# Altium integrated library Op Amp - Comp.IntLib: 109 symbols
Pins are listed as number, name and electrical type; pins without a type are passive.

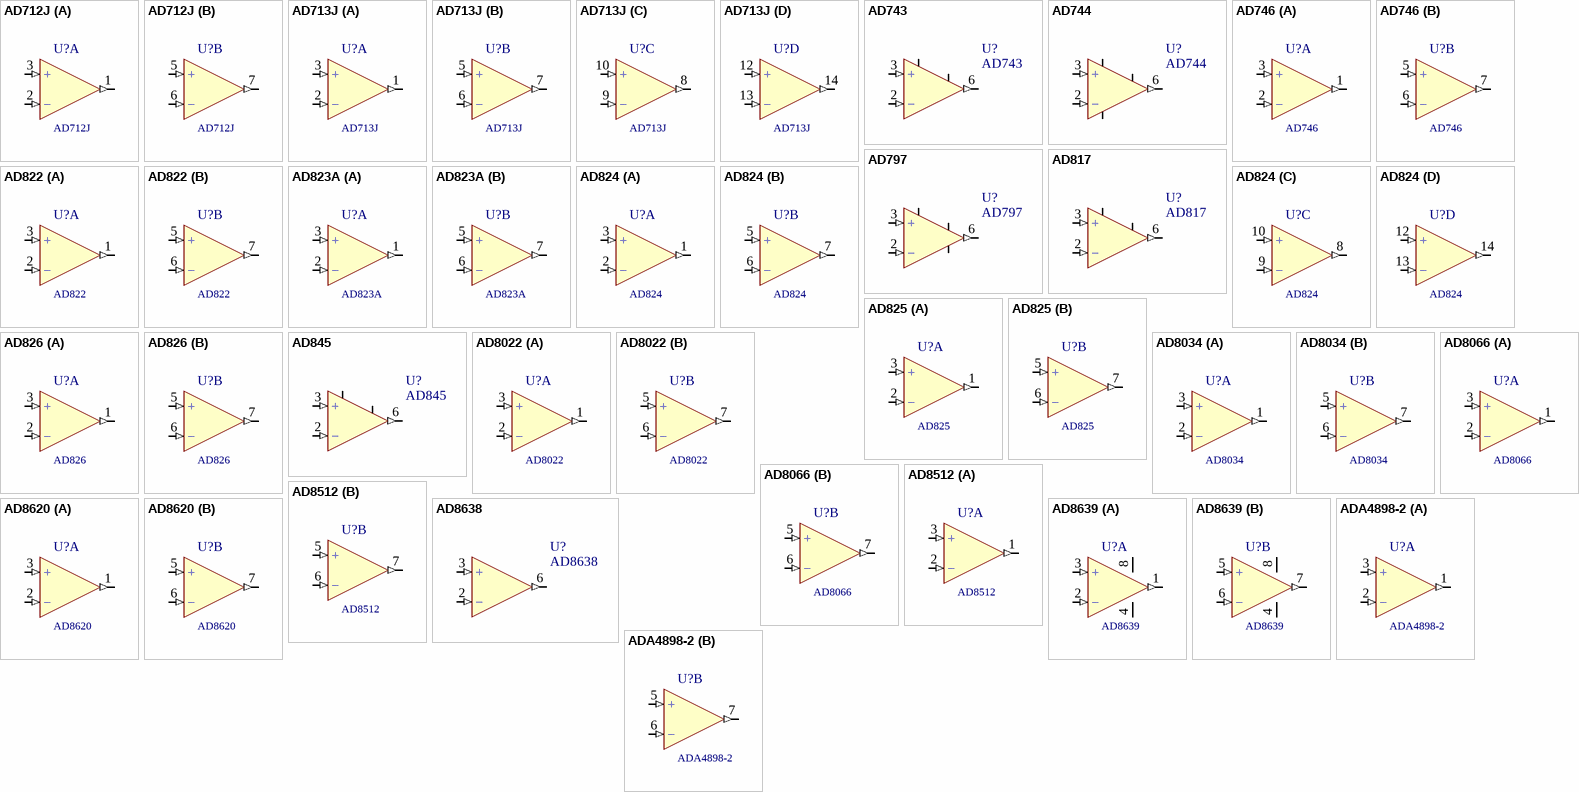
[diagram p0: symbols AD712J to ADA4898-2]

## AD712J
designator U?
FET 3mV 20uV/C 4MHz 20/Vus 2.5mA 9-36V; Price: 6
footprint SO8-150
simulation model AD712J (Model Description)
pins on every part: 4 V- (power) hidden to V-, 8 V+ (power) hidden to V+
part A pins: 1 OUT (out), 2 -IN (in), 3 +IN (in)
part B pins: 5 +IN (in), 6 -IN (in), 7 OUT (out)

## AD713J
designator U?
FET 1.5mV 20uV/C 4MHz 20/Vus 2.5mA 9-36V; Price: 26
footprint SO14-150
simulation model AD713J (Model Description)
pins on every part: 4 V+ (power) hidden to V+, 11 V- (power) hidden to V-
part A pins: 1 OUT (out), 2 IN- (in), 3 IN+ (in)
part B pins: 5 IN+ (in), 6 IN- (in), 7 OUT (out)
part C pins: 8 OUT (out), 9 IN- (in), 10 IN+ (in)
part D pins: 12 IN+ (in), 13 IN- (in), 14 OUT (out)

## AD743
designator U?
FET 1mV  4.5MHz 2.8V/uS  8.1mA 36V; Price: 0.8
footprint DIL8-300a
simulation model AD743 (SUBCKT)
pins: 1 N1/Comp, 2 -IN (in), 3 +IN (in), 4 V- (power) hidden to V-, 5 N2/Comp, 6 OUT (out), 7 V+ (power) hidden to V+

## AD744
designator U?
FET 1mV 13MHz 75V/uS 3.5mA 9-36V; Price: 13.8
footprint DIL8-300a
simulation model AD744 (SubCKT)
pins: 1 Nul, 2 -IN (in), 3 +IN (in), 4 V- (power) hidden to V-, 5 Com2, 6 OUT (out), 7 V+ (power) hidden to V+, 8 Nul/Com1

## AD746
designator U?
FET 1.5mV 13MHz  75V/uS 7mA 9-36V; Price: 28
footprint DIL8-300a
simulation model AD746 (Model Description)
pins on every part: 4 V- (power) hidden to V-, 8 V+ (power) hidden to V+
part A pins: 1 OUT (out), 2 -IN (in), 3 +IN (in)
part B pins: 5 +IN (in), 6 -IN (in), 7 OUT (out)

## AD797
designator U?
0.9nV/Hz 80uV 110MHz 20V/uS 36V; Price: 27
footprint DIL8-300a
simulation model AD797 (SubCKT)
pins: 1 Nul, 2 -IN (in), 3 +IN (in), 4 V- (power) hidden to V-, 5 Nul, 6 OUT (out), 7 V+ (power) hidden to V+, 8 Comp

## AD817
designator U?
2mV  50MHz 350V/uS  7mA 5-36V Rout 8om; Price: 0.8
footprint DIL8-300a
simulation model AD817 (SUBCKT)
pins: 1 N1, 2 -IN (in), 3 +IN (in), 4 V- (power) hidden to V-, 5 hidden, 6 OUT (out), 7 V+ (power) hidden to V+, 8 N2

## AD822
designator U?
FET 0.8mV 1.8MHz  3V/uS R/R Out 1.6mA 5-30V; Price: 18.7
footprint DIL8-300a
simulation model AD822 (Model Description)
pins on every part: 4 V- (power) hidden to V-, 8 V+ (power) hidden to V+
part A pins: 1 OUT (out), 2 -IN (in), 3 +IN (in)
part B pins: 5 +IN (in), 6 -IN (in), 7 OUT (out)

## AD823A
designator U?
FET 3.5mV 19MHz  35V/uS 6.3mA R/R Out 3-36V; Price: 16.4
footprint DIL8-300a
simulation model AD823AN (Model Description)
pins on every part: 4 V- (power) hidden to V-, 8 V+ (power) hidden to V+
part A pins: 1 OUT (out), 2 -IN (in), 3 +IN (in)
part B pins: 5 +IN (in), 6 -IN (in), 7 OUT (out)

## AD824
designator U?
FET 1.5mV 2MHz 22V/uS R/R Out 0.5mA 3-30V; Price: 25.4
footprint DIL14-300
simulation model AD824 (Model Description)
pins on every part: 4 V+ (power) hidden to V+, 11 V- (power) hidden to V-
part A pins: 1 OUT (out), 2 IN- (in), 3 IN+ (in)
part B pins: 5 IN+ (in), 6 IN- (in), 7 OUT (out)
part C pins: 8 OUT (out), 9 IN- (in), 10 IN+ (in)
part D pins: 12 IN+ (in), 13 IN- (in), 14 OUT (out)

## AD825
designator U?
FET 26MHz  125V/uS 36V; Price: 10.75
footprint DIL8-300a
simulation model AD825 (Model Description)
pins on every part: 4 V- (power) hidden to V-, 8 V+ (power) hidden to V+
part A pins: 1 OUT (out), 2 -IN (in), 3 +IN (in)
part B pins: 5 +IN (in), 6 -IN (in), 7 OUT (out)

## AD826
designator U?
50MHz  350V/uS 6.6mA 36V; Price: 14.43
footprint DIL8-300a
simulation model AD826 (Model Description)
pins on every part: 4 V- (power) hidden to V-, 8 V+ (power) hidden to V+
part A pins: 1 OUT (out), 2 -IN (in), 3 +IN (in)
part B pins: 5 +IN (in), 6 -IN (in), 7 OUT (out)

## AD845
designator U?
FET 0.25mV  12.8MHz 100V/uS  10mA 36V; Price: 0.8
footprint DIL8-300a
simulation model AD845 (SUBCKT)
pins: 1 N1, 2 -IN (in), 3 +IN (in), 4 V- (power) hidden to V-, 5 N2, 6 OUT (out), 7 V+ (power) hidden to V+

## AD8022
designator U?
130MHz  50V/uS 4mA 26V; Price: 9.17
footprint DIL8-300a
simulation model AD8022 (Model Description)
pins on every part: 4 V- (power) hidden to V-, 8 V+ (power) hidden to V+
part A pins: 1 OUT (out), 2 -IN (in), 3 +IN (in)
part B pins: 5 +IN (in), 6 -IN (in), 7 OUT (out)

## AD8034
designator U?
FET 40MHz  80V/uS 26V; Price: 9.17
footprint DIL8-300a
simulation model AD8034 (Model Description)
pins on every part: 4 V- (power) hidden to V-, 8 V+ (power) hidden to V+
part A pins: 1 OUT (out), 2 -IN (in), 3 +IN (in)
part B pins: 5 +IN (in), 6 -IN (in), 7 OUT (out)

## AD8066
designator U?
FET 60MHz 180V/uS 26.3V; Price: 11.3
footprint DIL8-300a
simulation model AD8066 (SubCKT)
pins on every part: 4 V- (power) hidden to V-, 8 V+ (power) hidden to V+
part A pins: 1 OUT (out), 2 -IN (in), 3 +IN (in)
part B pins: 5 +IN (in), 6 -IN (in), 7 OUT (out)

## AD8512
designator U?
FET 0.4mV 8MHz  20V/uS 2.2mA 36V; Price: 8.5
footprint DIL8-300a
simulation model AD8512 (Model Description)
pins on every part: 4 V- (power) hidden to V-, 8 V+ (power) hidden to V+
part A pins: 1 OUT (out), 2 -IN (in), 3 +IN (in)
part B pins: 5 +IN (in), 6 -IN (in), 7 OUT (out)

## AD8620
designator U?
FET 25MHz 50V/uS 27.3V; Price: 41.5
footprint DIL8-300a
simulation model AD8610-X (Model Description)
pins on every part: 4 V- (power) hidden to V-, 8 V+ (power) hidden to V+
part A pins: 1 OUT (out), 2 -IN (in), 3 +IN (in)
part B pins: 5 +IN (in), 6 -IN (in), 7 OUT (out)

## AD8638
designator U?
9uV 60nV/C 1.35MHz 2.5V/uS  1.3mA 5-16V; Price: 9
footprint DIL8-300a
simulation model AD8638 (SUBCKT)
pins: 2 -IN (in), 3 +IN (in), 4 V- (power) hidden to V-, 5 hidden, 6 OUT (out), 7 V+ (power) hidden to V+

## AD8639
designator U?
9uV 60nV/C 1.35MHz 2.5V/uS  1.3mA 5-16V; Price: 11.52
footprint SO8-150
pins on every part: 4 V- (power) hidden to V-, 8 V+ (power) hidden to V+
part A pins: 1 OUT (out), 2 -IN (in), 3 +IN (in)
part B pins: 5 +IN (in), 6 -IN (in), 7 OUT (out)

## ADA4898-2
designator U?
0.9nV/Hz 65MHz  55V/uS 7.5mA 33V; Price: 21.4
footprint DIL8-300a
simulation model ADA4898 (Model Description)
pins on every part: 4 V- (power) hidden to V-, 8 V+ (power) hidden to V+
part A pins: 1 OUT (out), 2 -IN (in), 3 +IN (in)
part B pins: 5 +IN (in), 6 -IN (in), 7 OUT (out)

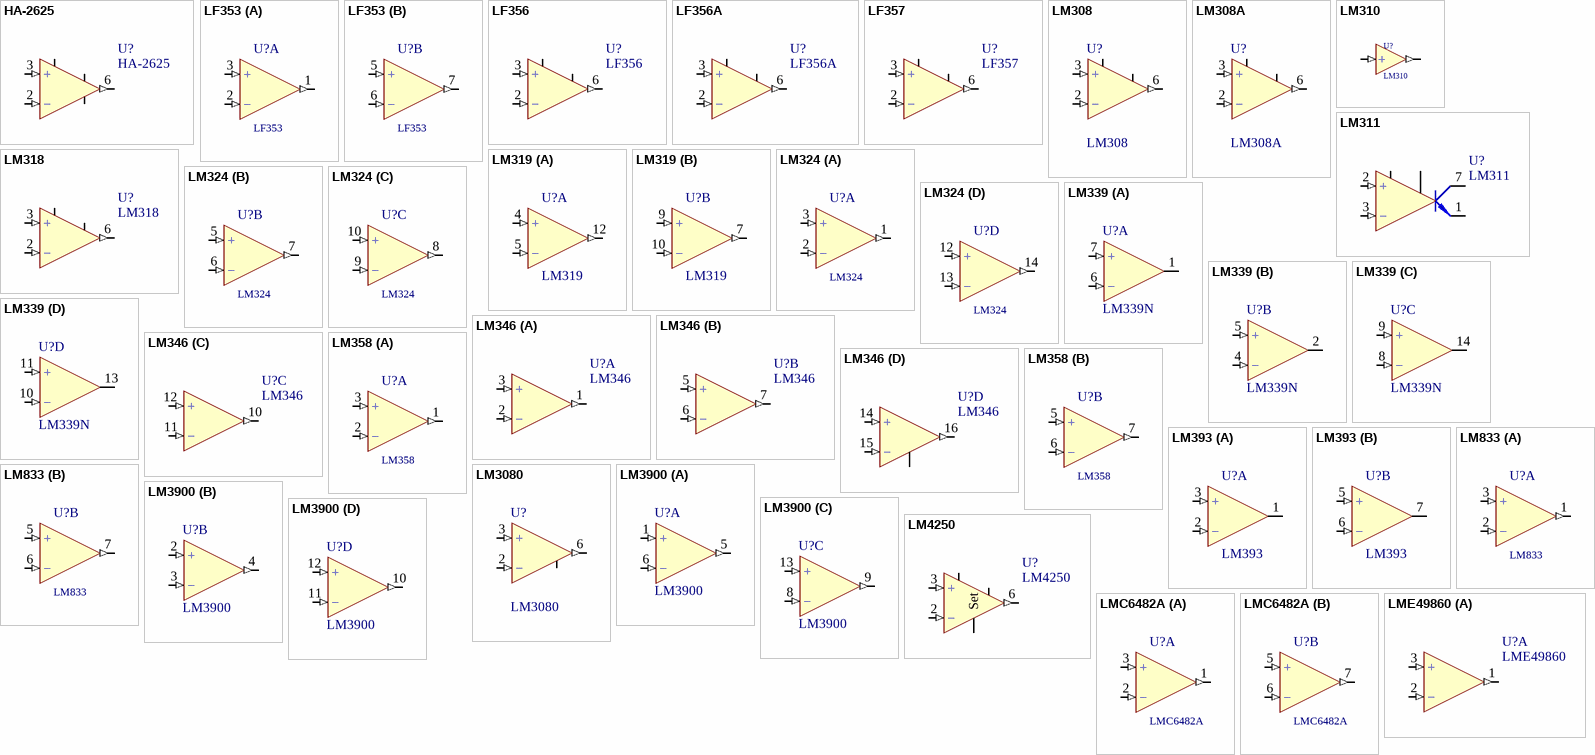
[diagram p1: symbols HA-2625 to LME49860]

## HA-2625
designator U?
100MHz 735V/uS  3mA 45V
footprint DIL8-300a
simulation model HA2620 (SUBCKT)
pins: 1 N1, 2 -IN (in), 3 +IN (in), 4 V- (power) hidden to V-, 5 N2, 6 OUT (out), 7 V+ (power) hidden to V+, 8 Comp

## LF353
designator U?
FET 10mV 4MHz 13V/us 1.8mA 7-36V; Price: 0.48
footprint DIL8-300a
simulation model LF353-NS (Model Description)
pins on every part: 4 V- (power) hidden to V-, 8 V+ (power) hidden to V+
part A pins: 1 OUT (out), 2 -IN (in), 3 +IN (in)
part B pins: 5 +IN (in), 6 -IN (in), 7 OUT (out)

## LF356
designator U?
FET 3mV  5MHz 12V/uS  5mA 10-36V; Price: 1
footprint DIL8-300a
simulation model LF356-NS (SUBCKT)
pins: 1 N1/Comp, 2 -IN (in), 3 +IN (in), 4 V- (power) hidden to V-, 5 N2/Comp, 6 OUT (out), 7 V+ (power) hidden to V+

## LF356A
designator U?
FET 1mV  5MHz 12V/uS  5mA 10-36V; Price: 1
footprint DIL8-300a
simulation model LF356A (SUBCKT)
pins: 1 N1/Comp, 2 -IN (in), 3 +IN (in), 4 V- (power) hidden to V-, 5 N2/Comp, 6 OUT (out), 7 V+ (power) hidden to V+

## LF357
designator U?
FET 3mV 20MHz 50/uS 5mA K>5 10-36V; Price: 1.5
footprint DIL8-300a
simulation model LF357/NS (Model Description)
pins: 1 N1/Comp, 2 -IN (in), 3 +IN (in), 4 V- (power) hidden to V-, 5 N2/Comp, 6 OUT (out), 7 V+ (power) hidden to V+

## LM308
designator U?
7.5mV 7nA 30uV/C 4-40V 0.15mA
footprint DIL8-300a
simulation model LM308 (Model Description)
pins: 1 COMP1, 2 -IN (in), 3 +IN (in), 4 Vss hidden to V-, 5 hidden, 6 OUT (out), 7 Vdd (power) hidden to Vdd, 8 COMP2

## LM308A
designator U?
2mV 2nA 30uV/C 4-40V 0.15mA
footprint DIL8-300a
simulation model LM308A (Model Description)
pins: 1 COMP1, 2 -IN (in), 3 +IN (in), 4 Vss hidden to Vss, 5 hidden, 6 OUT (out), 7 Vdd hidden to Vdd, 8 COMP2

## LM310
designator U?
Bufer
footprint DIL8-300a
pins: 1 Bal hidden, 2 hidden, 3 +IN (in), 4 V- hidden to V-, 5 hidden, 6 OUT (out), 7 V+ hidden to V+, 8 Bal hidden

## LM311
designator U?
7.5mV 250nA 0.2uS 3mA 5-30V
footprint DIL8-300a
simulation model LM311 (Model Description)
pins: 1 EOUT (oe), 2 IN+ (in), 3 IN- (in), 4 V- (power) hidden to V-, 5 BALANCE, 6 STROBE, 7 COUT (oc), 8 V+ (power) hidden to V+

## LM318
designator U?
4mV 15MHz 70/uS 4.5mA 10-40V; Price: 1.5
footprint DIL8-300a
simulation model LM318/NS (Model Description)
pins: 1 N1/Comp, 2 -IN (in), 3 +IN (in), 4 V- (power) hidden to V-, 5 N2/Comp, 6 OUT (out), 7 V+ (power) hidden to V+

## LM319
designator U?
8mV 1uA 80nS 5-36V 8mA; Price: 2.74
footprint DIL14-300
pins on every part: 6 V+ (power) hidden to V+, 11 V+ (power) hidden to V+
part A pins: 3 GND (power) hidden to GND, 4 Vss (in), 5 -IN (in), 12 OUT (out)
part B pins: 7 OUT (out), 8 g (power) hidden to g, 9 +IN (in), 10 -IN (in)

## LM324
designator U?
7mV 250nA 7uV/C 1MHz 0.6V/uS 0.8mA 3-32V; Price: 0.27
footprint DIL14-300
simulation model LM324 (Model Description)
pins on every part: 4 V+ (power) hidden to V+, 11 V- (power) hidden to V-
part A pins: 1 OUT (out), 2 IN- (in), 3 IN+ (in)
part B pins: 5 IN+ (in), 6 IN- (in), 7 OUT (out)
part C pins: 8 OUT (out), 9 IN- (in), 10 IN+ (in)
part D pins: 12 IN+ (in), 13 IN- (in), 14 OUT (out)

## LM339
designator U?, comment LM339N
5mV 250nA 1.5uS 2-36V 2mA; Price: 0.24
footprint DIL14-300
simulation model LM339 (Model Description)
pins on every part: 3 V+ (power) hidden to V+, 12 g (power) hidden to g
part A pins: 1 OUT (oc), 6 -In (in), 7 +In (in)
part B pins: 2 OUT (oc), 4 -In (in), 5 +In (in)
part C pins: 8 -In (in), 9 +In (in), 14 OUT (oc)
part D pins: 10 -IN (in), 11 +In (in), 13 OUT (oc)

## LM346
designator U?
Programable
footprint DIL16-300a
part A pins: 1 OUT (out), 2 -IN (in), 3 +IN (in), 4 V+ (power) hidden to V+, 8 Set ABD hidden, 13 V- (power) hidden to V-
part B pins: 5 +IN (in), 6 -IN (in), 7 OUT (out)
part C pins: 10 OUT (out), 11 -IN (in), 12 +IN (in)
part D pins: 9 Set C, 14 +IN (in), 15 -IN (in), 16 OUT (out)

## LM358
designator U?
7mV 250nA 7uV/C 1MHz 0.6V/uS 0.8mA 3-32V; Price: 0.24
footprint DIL8-300a
simulation model LM358 (Model Description)
pins on every part: 4 V- (power) hidden to V-, 8 V+ (power) hidden to V+
part A pins: 1 OUT (out), 2 -IN (in), 3 +IN (in)
part B pins: 5 +IN (in), 6 -IN (in), 7 OUT (out)

## LM393
designator U?
5mV 250nA 1.5uS 2-36V 1mA 3-32V; Price: 0.25
footprint DIL8-300a
simulation model LM393 (Model Description)
footprint SO8-150
pins on every part: 4 V- (power) hidden to V-, 8 Vc+ (power) hidden to VC+
part A pins: 1 OUT (oc), 2 -IN (in), 3 +IN (in)
part B pins: 5 +IN (in), 6 -IN (in), 7 OUT (oc)

## LM833
designator U?
5mV 4.5nV/Hz 15MHz 7V/uS  4mA 10-36V; Price: 1.2
footprint DIL8-300a
simulation model LM833-NS (Model Description)
pins on every part: 4 V- (power) hidden to V-, 8 V+ (power) hidden to V+
part A pins: 1 OUT (out), 2 -IN (in), 3 +IN (in)
part B pins: 5 +IN (in), 6 -IN (in), 7 OUT (out)

## LM3080
designator U?
Transconductance
footprint DIL8-300a
pins: 2 IN- (in), 3 IN+ (in), 4 V- (power) hidden to V-, 5 BIAS, 6 OUT (out), 7 V+ (power) hidden to V+

## LM3900
designator U?
Norton
footprint DIL14-300
pins on every part: 7 V+ (power) hidden to V+, 14 V+ (power) hidden to V+
part A pins: 1 +IN (in), 5 OUT (out), 6 -IN (in)
part B pins: 2 +IN (in), 3 -IN (in), 4 Vss (out)
part C pins: 8 -IN (in), 9 OUT (out), 13 +IN (in)
part D pins: 10 OUT (out), 11 -IN (in), 12 +IN (in)

## LM4250
designator U?
5mV  2-36V Programable; Price: 0.8
footprint DIL8-300a
simulation model LM4250-NS (Model Description)
pins: 1 N1/Comp, 2 -IN (in), 3 +IN (in), 4 V- (power) hidden to V-, 5 N2/Comp, 6 OUT (out), 7 V+ (power) hidden to V+, 8 Set

## LMC6482A
designator U?
CMOS 0.75mV 4pA 1.5MHz 1V/uS R/R In/Out 15.5V 1.5mA; Price: 1.7
footprint SO8-150
simulation model LMC6482A/NS (Model Description)
pins on every part: 4 V- (power) hidden to V-, 8 V+ (power) hidden to V+
part A pins: 1 OUT (out), 2 -IN (in), 3 +IN (in)
part B pins: 5 +IN (in), 6 -IN (in), 7 OUT (out)

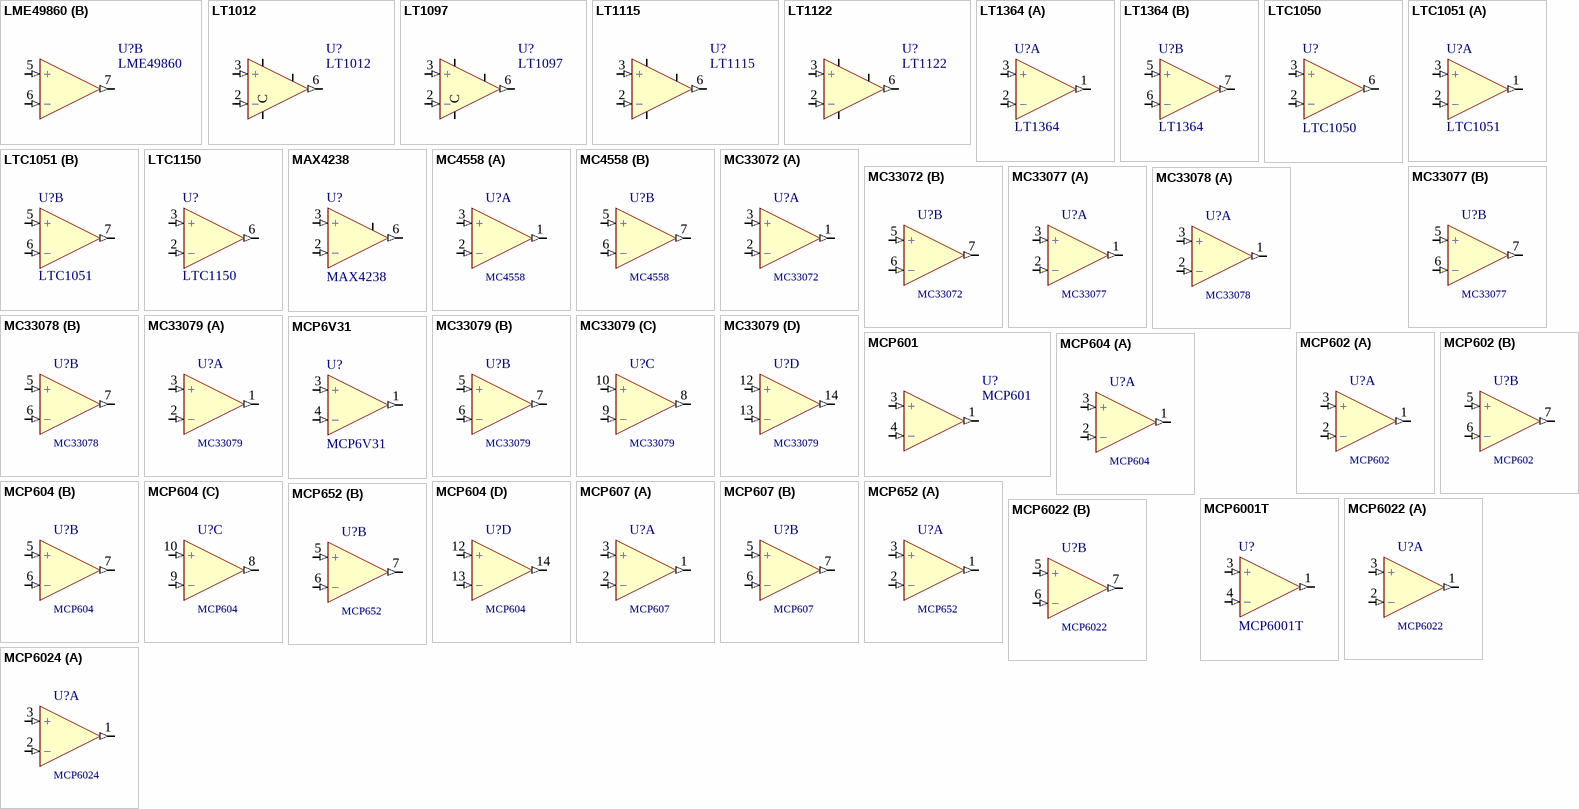
[diagram p2: symbols LME49860 to MCP6024]

## LME49860
designator U?
0.7mV  4.7nV/Hz 45MHz 15V/uS  4.8mA 10-36V; Price: 0.8
footprint DIL8-300a
simulation model LME49860 (SUBCKT)
part A pins: 1 OUT (out), 2 -IN (in), 3 +IN (in), 4 V- (power) hidden to V-, 8 V+ (power) hidden to V+
part B pins: 5 +IN (in), 6 -IN (in), 7 OUT (out)

## LT1012
designator U?
0.05mV 0.15nA 0.7MHz 0.2V/uS 0.6mA; Price: 23
footprint DIL8-300a
simulation model LT1012 (SubCKT)
pins: 1 Comp1, 2 -IN (in), 3 +IN (in), 4 V- (power) hidden to V-, 5 C, 6 OUT (out), 7 V+ (power) hidden to V+, 8 Comp2
1 alternate drawing of the same symbol

## LT1097
designator U?
0.05mV 0.25nA 0.7MHz 0.2V/uS 0.56mA; Price: 12.2
footprint DIL8-300a
simulation model LT1097 (SubCKT)
pins: 1 Comp1, 2 -IN (in), 3 +IN (in), 4 V- (power) hidden to V-, 5 C, 6 OUT (out), 7 V+ (power) hidden to V+, 8 Comp2
1 alternate drawing of the same symbol

## LT1115
designator U?
0.9nV/Hz 0.2mV 40MHz 15V/uS 44V; Price: 20
footprint DIL8-300a
simulation model LT1115 (SubCKT)
pins: 1 Comp1, 2 -IN (in), 3 +IN (in), 4 V- (power) hidden to V-, 5 C, 6 OUT (out), 7 V+ (power) hidden to V+, 8 Comp2

## LT1122
designator U?
FET 14MHz 60VuS 40V; Price: 13.6
footprint DIL8-300a
simulation model LT1122 (SubCKT)
pins: 1 Comp1, 2 -IN (in), 3 +IN (in), 4 V- (power) hidden to V-, 5 C, 6 OUT (out), 7 V+ (power) hidden to V+, 8 Comp2

## LT1364
designator U?
1.5mV 70MHz 1000V/uS 5-30V 7mA; Price: 22.3
footprint DIL8-300a
simulation model LT1364 (Model Description)
pins on every part: 4 V- hidden to V-, 8 V+ (power) hidden to V+
part A pins: 1 OUT (out), 2 -IN (in), 3 +IN (in)
part B pins: 5 +IN (in), 6 -IN (in), 7 OUT (out)

## LTC1050
designator U?
0.5uV 2.5MHz 4V/us 16V 1mA; Price: 15
footprint DIL8-300a
simulation model LTC1050 (SubCKT)
pins: 2 -IN (in), 3 +IN (in), 4 V- (power) hidden to V-, 5 Clock (in) hidden, 6 OUT (out), 7 V+ (power) hidden to V+

## LTC1051
designator U?
0.5uV 2.5MHz 4V/uS 16V 1mA; Price: 26
footprint DIL8-300a
pins on every part: 4 V- hidden to V-, 8 V+ (power) hidden to V+
part A pins: 1 OUT (out), 2 -IN (in), 3 +IN (in)
part B pins: 5 +IN (in), 6 -IN (in), 7 OUT (out)

## LTC1150
designator U?
0.5uV 2.5MHz 3V/us 30V 0.8mA; Price: 25
footprint DIL8-300a
simulation model LTC1150 (SubCKT)
pins: 1 hidden, 2 -IN (in), 3 +IN (in), 4 V- (power) hidden to V-, 5 hidden, 6 OUT (out), 7 V+ (power) hidden to V+

## MAX4238
designator U?
2uV 1MHz 0.35V/us R/R Out 0.6mA 2.7-5.5V; Price: 2.54
footprint SO8-150
simulation model MAX4238 (Model Description)
pins: 1 Sh (in), 2 -IN (in), 3 +IN (in), 4 V- (power) hidden to V-, 5 hidden, 6 OUT (out), 7 V+ (power) hidden to V+

## MC4558
designator U?
5.5MHz 2.2V/uS 2.8mA 44V; Price: 0.42
footprint DIL8-300a
simulation model LM741/NS (Model Description)
pins on every part: 4 V- (power) hidden to V-, 8 V+ (power) hidden to V+
part A pins: 1 OUT (out), 2 -IN (in), 3 +IN (in)
part B pins: 5 +IN (in), 6 -IN (in), 7 OUT (out)

## MC33072
designator U?
5mV 100nA 6nA 4.5MHz 13V/uS 3-44V 2mA; Price: 3.4
footprint DIL8-300a
simulation model MC33072/ON (Model Description)
pins on every part: 4 V- (power) hidden to V-, 8 V+ (power) hidden to V+
part A pins: 1 OUT (out), 2 -IN (in), 3 +IN (in)
part B pins: 5 +IN (in), 6 -IN (in), 7 OUT (out)

## MC33077
designator U?
4.5nV/Hz 7.5MHz 11V/uS 5-36V 3.5mA; Price: 4.8
footprint DIL8-300a
simulation model MC33077/NS (Model Description)
pins on every part: 4 V- (power) hidden to V-, 8 V+ (power) hidden to V+
part A pins: 1 OUT (out), 2 -IN (in), 3 +IN (in)
part B pins: 5 +IN (in), 6 -IN (in), 7 OUT (out)

## MC33078
designator U?
4.5nV/Hz 16MHz 7V/uS 4.1mA 10-36V; Price: 1.26
footprint DIL8-300a
simulation model MC33078/ON (Model Description)
pins on every part: 4 V- (power) hidden to V-, 8 V+ (power) hidden to V+
part A pins: 1 OUT (out), 2 -IN (in), 3 +IN (in)
part B pins: 5 +IN (in), 6 -IN (in), 7 OUT (out)

## MC33079
designator U?
4.5nV/Hz 16MHz 7V/uS 4.1mA 10-36V; Price: 1.14
footprint DIL14-300
simulation model MC33078/ON (Model Description)
pins on every part: 4 V+ (power) hidden to V+, 11 V- (power) hidden to V-
part A pins: 1 OUT (out), 2 IN- (in), 3 IN+ (in)
part B pins: 5 IN+ (in), 6 IN- (in), 7 OUT (out)
part C pins: 8 OUT (out), 9 IN- (in), 10 IN+ (in)
part D pins: 12 IN+ (in), 13 IN- (in), 14 OUT (out)

## MCP6V31
designator U?
8uV 0.3MHz 0.13V/us 1.8-5.5V R/R In/Out 23uA; Price: 1.8
footprint SOT23-5
pins: 1 OUT (out), 2 V- (power) hidden to V-, 3 +IN (in), 4 -IN (in), 5 V+ (power) hidden to V+

## MCP601
designator U?
CMOS 2mV 2.8MHz R/R Out 0.23mA 2.7-6V; Price: 0.72
footprint SOT23-5
footprint SO8-150
pins: 1 OUT (out), 2 V- (power) hidden to V-, 3 +IN (in), 4 -IN (in), 5 V+ (power) hidden to V+

## MCP602
designator U?
CMOS 2mV 2.8MHz R/R Out 0.23mA 2.7-6V; Price: 1.25
footprint DIL8-300a
simulation model MCP601 (Model Description)
pins on every part: 4 V- (power) hidden to V-, 8 V+ (power) hidden to V+
part A pins: 1 OUT (out), 2 -IN (in), 3 +IN (in)
part B pins: 5 +IN (in), 6 -IN (in), 7 OUT (out)

## MCP604
designator U?
CMOS 2mV 2.8MHz R/R Out 0.23mA 2.7-6V; Price: 3.65
footprint DIL14-300
simulation model MCP601 (Model Description)
pins on every part: 4 V+ (power) hidden to V+, 11 g (power) hidden to g
part A pins: 1 OUT (out), 2 IN- (in), 3 IN+ (in)
part B pins: 5 IN+ (in), 6 IN- (in), 7 OUT (out)
part C pins: 8 OUT (out), 9 IN- (in), 10 IN+ (in)
part D pins: 12 IN+ (in), 13 IN- (in), 14 OUT (out)

## MCP607
designator U?
CMOS 0.25mV 155kHz R/R Out 25uA 2.5-6V; Price: 1.90
footprint DIL8-300a
pins on every part: 4 V- (power) hidden to V-, 8 V+ (power) hidden to V+
part A pins: 1 OUT (out), 2 -IN (in), 3 +IN (in)
part B pins: 5 +IN (in), 6 -IN (in), 7 OUT (out)

## MCP652
designator U?
CMOS 0.2mV 50MHz 30V/uS R/R Out 6mA 2.5-5.5V; Price: 1.25
footprint DIL8-300a
simulation model MCP651 (Model Description)
pins on every part: 4 V- (power) hidden to V-, 8 V+ (power) hidden to V+
part A pins: 1 OUT (out), 2 -IN (in), 3 +IN (in)
part B pins: 5 +IN (in), 6 -IN (in), 7 OUT (out)

## MCP6001T
designator U?
4.5mV 1MHz 0.6V/us 1.8-6V R/R In/Out 100uA; Price: 0.42
footprint SOT23-5
pins: 1 OUT (out), 2 V- (power) hidden to V-, 3 +IN (in), 4 -IN (in), 5 V+ (power) hidden to V+

## MCP6022
designator U?
CMOS 0.25mV 10MHz R/R In/Out 1mA 2.5-5.5V; Price: 1.25
footprint DIL8-300a
simulation model MCP6021 (Model Description)
pins on every part: 4 V- (power) hidden to V-, 8 V+ (power) hidden to V+
part A pins: 1 OUT (out), 2 -IN (in), 3 +IN (in)
part B pins: 5 +IN (in), 6 -IN (in), 7 OUT (out)

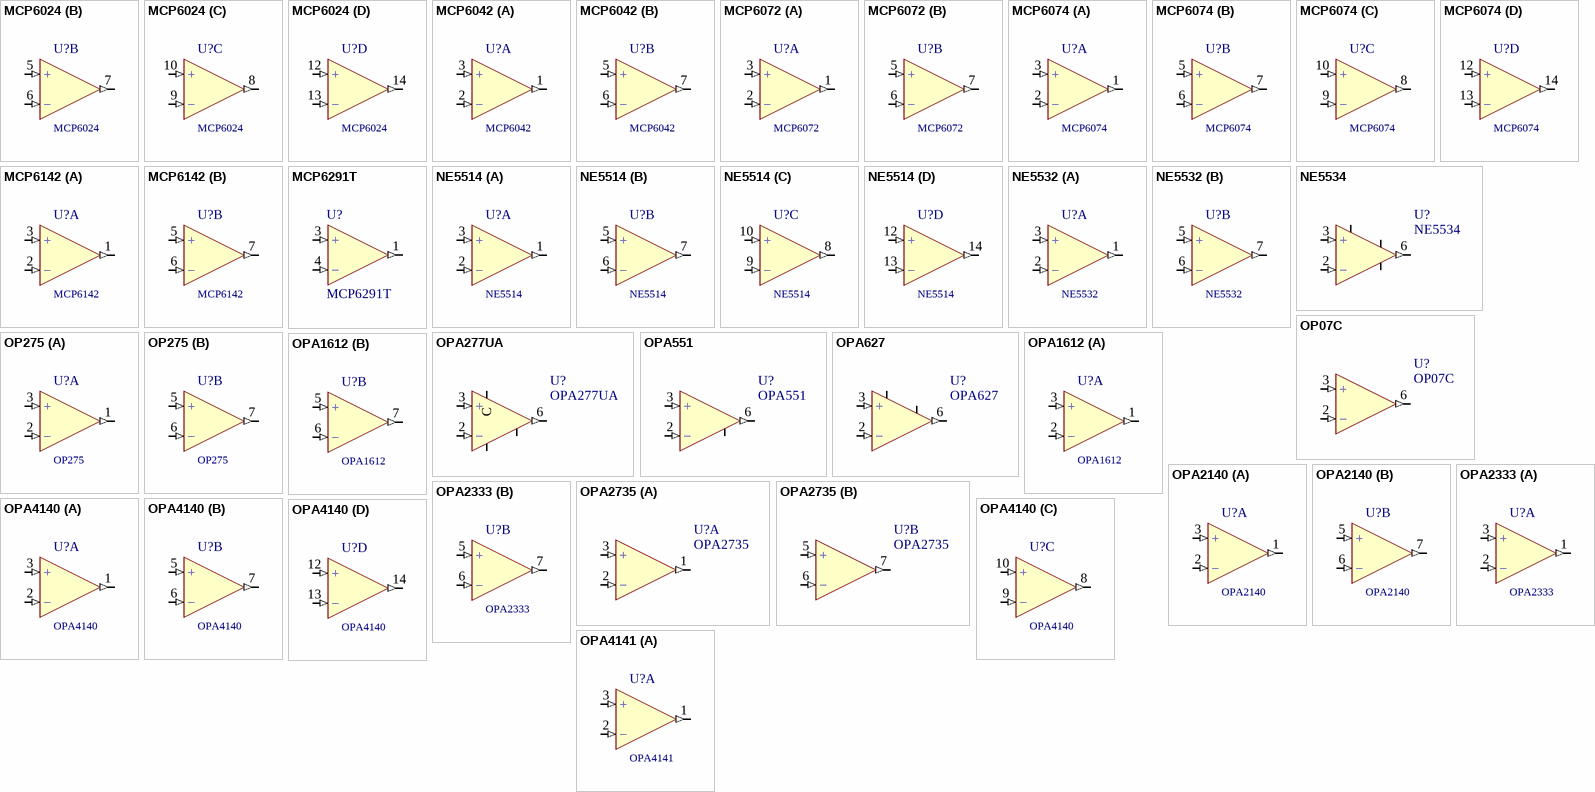
[diagram p3: symbols MCP6024 to OPA4141]

## MCP6024
designator U?
CMOS 0.25mV 10MHz R/R In/Out 1mA 2.5-5.5V; Price: 3.65
footprint DIL14-300
simulation model MCP6021 (Model Description)
pins on every part: 4 V+ (power) hidden to V+, 11 g (power) hidden to g
part A pins: 1 OUT (out), 2 IN- (in), 3 IN+ (in)
part B pins: 5 IN+ (in), 6 IN- (in), 7 OUT (out)
part C pins: 8 OUT (out), 9 IN- (in), 10 IN+ (in)
part D pins: 12 IN+ (in), 13 IN- (in), 14 OUT (out)

## MCP6042
designator U?
CMOS 3mV 100kHz R/R In/Out 0.6uA 1.4-5.5V; Price: 1.4
footprint DIL8-300a
pins on every part: 4 V- (power) hidden to V-, 8 V+ (power) hidden to V+
part A pins: 1 OUT (out), 2 -IN (in), 3 +IN (in)
part B pins: 5 +IN (in), 6 -IN (in), 7 OUT (out)

## MCP6072
designator U?
CMOS 0.15mV 1.2MHz R/R In/Out 110uA; Price: 1.25
footprint SO8-150
pins on every part: 4 V- (power) hidden to V-, 8 V+ (power) hidden to V+
part A pins: 1 OUT (out), 2 -IN (in), 3 +IN (in)
part B pins: 5 +IN (in), 6 -IN (in), 7 OUT (out)

## MCP6074
designator U?
CMOS 0.15mV 1.2MHz R/R In/Out 110uA; Price: 3.65
footprint DIL14-300
footprint SO14-150
pins on every part: 4 V+ (power) hidden to V+, 11 g (power) hidden to g
part A pins: 1 OUT (out), 2 IN- (in), 3 IN+ (in)
part B pins: 5 IN+ (in), 6 IN- (in), 7 OUT (out)
part C pins: 8 OUT (out), 9 IN- (in), 10 IN+ (in)
part D pins: 12 IN+ (in), 13 IN- (in), 14 OUT (out)

## MCP6142
designator U?
CMOS 3mV 100kHz G=>10 R/R In/Out 0.6uA 1.8-6V; Price: 1.4
footprint DIL8-300a
pins on every part: 4 V- (power) hidden to V-, 8 V+ (power) hidden to V+
part A pins: 1 OUT (out), 2 -IN (in), 3 +IN (in)
part B pins: 5 +IN (in), 6 -IN (in), 7 OUT (out)

## MCP6291T
designator U?
3mV 10MHz 7V/us 2.4-6V R/R In/Out 1mA; Price: 1.13
footprint SOT23-5
pins: 1 OUT (out), 2 V- (power) hidden to V-, 3 +IN (in), 4 -IN (in), 5 V+ (power) hidden to V+

## NE5514
designator U?
5mV 20nA 3MHz 1V/uS 32V 10mA; Price: 2
footprint DIL14-300
pins on every part: 4 V+ (power) hidden to V+, 11 V- (power) hidden to V-
part A pins: 1 OUT (out), 2 IN- (in), 3 IN+ (in)
part B pins: 5 IN+ (in), 6 IN- (in), 7 OUT (out)
part C pins: 8 OUT (out), 9 IN- (in), 10 IN+ (in)
part D pins: 12 IN+ (in), 13 IN- (in), 14 OUT (out)

## NE5532
designator U?
5mV 10MHz 13/uS 6/uS 4mA; Price: 0.4
footprint DIL8-300a
simulation model NE5532 (Model Description)
footprint SO8-150
pins on every part: 4 V- (power) hidden to V-, 8 V+ (power) hidden to V+
part A pins: 1 OUT (out), 2 -IN (in), 3 +IN (in)
part B pins: 5 +IN (in), 6 -IN (in), 7 OUT (out)

## NE5534
designator U?
5mV 10MHz 13/uS 6/uS 4mA; Price: 0.45
footprint DIL8-300a
simulation model NE5534 (Model Description)
footprint SO8-150
pins: 1 N1, 2 -IN (in), 3 +IN (in), 4 V- (power) hidden to V-, 5 Comp, 6 OUT (out), 7 V+ (power) hidden to V+, 8 N2/Comp
1 alternate drawing of the same symbol

## OP07C
designator U?
0.15mV 6nA 0.6MHz 0.3V/uS 0.7mA; Price: 0.5
footprint DIL8-300a
simulation model OP07CS8 (Model Description)
footprint SO8-150
pins: 1 N2 hidden, 2 -IN (in), 3 +IN (in), 4 V- (power) hidden to V-, 5 hidden, 6 OUT (out), 7 V+ (power) hidden to V+, 8 N1 hidden
1 alternate drawing of the same symbol

## OP275
designator U?
FET 1mV 9MHz 22VuS 5mA 44V; Price: 9.17
footprint DIL8-300a
simulation model OP275 (Model Description)
pins on every part: 4 V- (power) hidden to V-, 8 V+ (power) hidden to V+
part A pins: 1 OUT (out), 2 -IN (in), 3 +IN (in)
part B pins: 5 +IN (in), 6 -IN (in), 7 OUT (out)

## OPA277UA
designator U?
0.05mV 1nA 1MHz 0.8V/uS 0.9mA; Price: 2.04
footprint SO8-150
simulation model OPA277 (SubCKT)
pins: 1 Comp1, 2 -IN (in), 3 +IN (in), 4 V- (power) hidden to V-, 5 C, 6 OUT (out), 7 V+ hidden to V+, 8 Comp2
1 alternate drawing of the same symbol

## OPA551
designator U?
FET 3mV  2MHz 15V/uS 7mA 8-60V; Price: 0.8
footprint DIL8-300a
simulation model OPA551 (SUBCKT)
pins: 2 -IN (in), 3 +IN (in), 4 V- (power) hidden to V-, 6 OUT (out), 7 V+ (power) hidden to V+, 8 Flag

## OPA627
designator U?
FET 0.15mV 16MHz 55V/uS 7mA 36V; Price: 67.2
footprint DIL8-300a
simulation model OPA627 (SUBCKT)
pins: 1 COMP1, 2 -IN (in), 3 +IN (in), 4 V- (power) hidden to V-, 5 COMP2, 6 OUT (out), 7 V+ (power) hidden to V+

## OPA1612
designator U?
1.1nV/Hz 0.5mV 40MHz 27V/us 3.6mA 4.5-36V; Price: 18
footprint SO8-150
simulation model OPA1612 (Model Description)
pins on every part: 4 V- (power) hidden to V-, 8 V+ (power) hidden to V+
part A pins: 1 OUT (out), 2 -IN (in), 3 +IN (in)
part B pins: 5 +IN (in), 6 -IN (in), 7 OUT (out)

## OPA2140
designator U?
FET 0.12mV 1uV/C 11MHz 20Vus 2mA 4.5-36V; Price: 18
footprint SO8-150
pins on every part: 4 V- (power) hidden to V-, 8 V+ (power) hidden to V+
part A pins: 1 OUT (out), 2 -IN (in), 3 +IN (in)
part B pins: 5 +IN (in), 6 -IN (in), 7 OUT (out)

## OPA2333
designator U?
CMOS 10uV 400pA 0.35MHz 0.16V/uS 17uA; Price: 2.86
footprint SO8-150
simulation model OPA333 (Model Description)
pins on every part: 4 V- (power) hidden to V-, 8 V+ (power) hidden to V+
part A pins: 1 OUT (out), 2 -IN (in), 3 +IN (in)
part B pins: 5 +IN (in), 6 -IN (in), 7 OUT (out)

## OPA2735
designator U?
5uV 50nV/C 1.6MHz 1.5V/uS  0.75mA 12V; Price: 0.8
footprint DIL8-300a
simulation model OPA735 (SUBCKT)
part A pins: 1 OUT (out), 2 -IN (in), 3 +IN (in), 4 V- (power) hidden to V-, 8 V+ (power) hidden to V+
part B pins: 5 +IN (in), 6 -IN (in), 7 OUT (out)

## OPA4140
designator U?
FET 0.12mV 1uV/C 11MHz 20V/us 2mA 4.5-36V; Price: 26
footprint SO14-150
pins on every part: 4 V+ (power) hidden to V+, 11 V- (power) hidden to V-
part A pins: 1 OUT (out), 2 IN- (in), 3 IN+ (in)
part B pins: 5 IN+ (in), 6 IN- (in), 7 OUT (out)
part C pins: 8 OUT (out), 9 IN- (in), 10 IN+ (in)
part D pins: 12 IN+ (in), 13 IN- (in), 14 OUT (out)

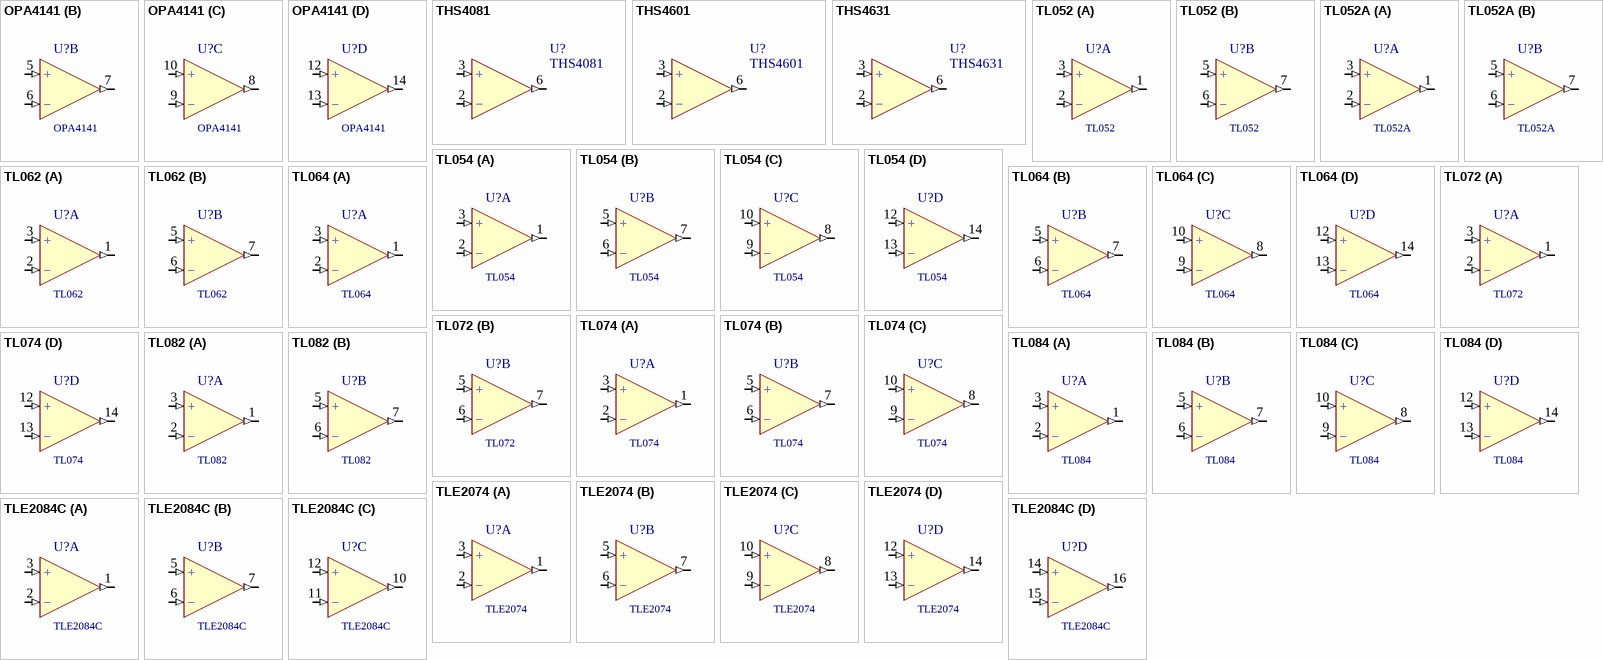
[diagram p4: symbols OPA4141 to TLE2084C]

## OPA4141
designator U?
FET 3.5mV 10uV/C 11MHz 20/Vus 2.3mA 4.5-36V; Price: 26
footprint SO14-150
pins on every part: 4 V+ (power) hidden to V+, 11 V- (power) hidden to V-
part A pins: 1 OUT (out), 2 IN- (in), 3 IN+ (in)
part B pins: 5 IN+ (in), 6 IN- (in), 7 OUT (out)
part C pins: 8 OUT (out), 9 IN- (in), 10 IN+ (in)
part D pins: 12 IN+ (in), 13 IN- (in), 14 OUT (out)

## THS4081
designator U?
175MHz 230V/uS 33V; Price: 12
footprint DIL8-300a
simulation model THS4081 (Model Description)
pins: 2 In- (in), 3 In+ (in), 4 V- (power) hidden to V-, 5 hidden, 6 Out (out), 7 V+ (power) hidden to V+

## THS4601
designator U?
FET 4mV 180MHz 100V/uS 10mA 33V; Price: 0.8
footprint DIL8-300a
pins: 2 In- (in), 3 In+ (in), 4 V- (power) hidden to V-, 5 hidden, 6 Out (out), 7 V+ (power) hidden to V+

## THS4631
designator U?
FET 2mV  900V/uS 10mA 33V; Price: 0.8
footprint DIL8-300a
simulation model THS4631 (Model Description)
pins: 2 -IN (in), 3 +IN (in), 4 V- (power) hidden to V-, 5 hidden, 6 OUT (out), 7 V+ (power) hidden to V+

## TL052
designator U?
FET 1.5mV 8uV/C 3Mhz 20V/us 3.2ma; Price: 2
footprint DIL8-300a
footprint SO8-150
simulation model TL052 (Model Description)
pins on every part: 4 V- (power) hidden to V-, 8 V+ (power) hidden to V+
part A pins: 1 OUT (out), 2 -IN (in), 3 +IN (in)
part B pins: 5 +IN (in), 6 -IN (in), 7 OUT (out)

## TL052A
designator U?
FET 0.6mV 8uV/C 3Mhz 20V/us 3.2ma; Price: 3.6
footprint DIL8-300a
footprint SO8-150
simulation model TL052 (Model Description)
pins on every part: 4 V- (power) hidden to V-, 8 V+ (power) hidden to V+
part A pins: 1 OUT (out), 2 -IN (in), 3 +IN (in)
part B pins: 5 +IN (in), 6 -IN (in), 7 OUT (out)

## TL054
designator U?
FET 1.5mV 8uV/C 3Mhz 20V/us 3.2ma; Price: 4
footprint DIL14-300
footprint SO14-150
simulation model TL052 (Model Description)
pins on every part: 4 V+ (power) hidden to V+, 11 V- (power) hidden to V-
part A pins: 1 OUT (out), 2 IN- (in), 3 IN+ (in)
part B pins: 5 IN+ (in), 6 IN- (in), 7 OUT (out)
part C pins: 8 OUT (out), 9 IN- (in), 10 IN+ (in)
part D pins: 12 IN+ (in), 13 IN- (in), 14 OUT (out)

## TL062
designator U?
FET 15mV 1Mhz 3.5V/us 0.2ma; Price: 0.35
footprint DIL8-300a
simulation model TL062 (Model Description)
footprint SO8-150
pins on every part: 4 V- (power) hidden to V-, 8 V+ (power) hidden to V+
part A pins: 1 OUT (out), 2 -IN (in), 3 +IN (in)
part B pins: 5 +IN (in), 6 -IN (in), 7 OUT (out)

## TL064
designator U?
FET 15mV 1MHz 3.5V/us 0.8mA; Price: 0.35
footprint DIL14-300
simulation model TL062 (Model Description)
footprint SO14-150
pins on every part: 4 V+ (power) hidden to V+, 11 V- (power) hidden to V-
part A pins: 1 OUT (out), 2 IN- (in), 3 IN+ (in)
part B pins: 5 IN+ (in), 6 IN- (in), 7 OUT (out)
part C pins: 8 OUT (out), 9 IN- (in), 10 IN+ (in)
part D pins: 12 IN+ (in), 13 IN- (in), 14 OUT (out)

## TL072
designator U?
FET 6mV 3MHz 13V/us 2.8mA; Price: 0.35
footprint DIL8-300a
simulation model TL072 (Model Description)
footprint SO8-150
pins on every part: 4 V- (power) hidden to V-, 8 V+ (power) hidden to V+
part A pins: 1 OUT (out), 2 -IN (in), 3 +IN (in)
part B pins: 5 +IN (in), 6 -IN (in), 7 OUT (out)

## TL074
designator U?
FET 9mV 3MHz 13V/us 2.8mA; Price: 0.35
footprint DIL14-300
simulation model TL072 (Model Description)
footprint SO14-150
pins on every part: 4 V+ (power) hidden to V+, 11 V- (power) hidden to V-
part A pins: 1 OUT (out), 2 IN- (in), 3 IN+ (in)
part B pins: 5 IN+ (in), 6 IN- (in), 7 OUT (out)
part C pins: 8 OUT (out), 9 IN- (in), 10 IN+ (in)
part D pins: 12 IN+ (in), 13 IN- (in), 14 OUT (out)

## TL082
designator U?
FET 15mV 3MHz 13V/us 2.8mA; Price: 0.35
footprint DIL8-300a
simulation model TL082 (Model Description)
footprint SO8-150
pins on every part: 4 V- (power) hidden to V-, 8 V+ (power) hidden to V+
part A pins: 1 OUT (out), 2 -IN (in), 3 +IN (in)
part B pins: 5 +IN (in), 6 -IN (in), 7 OUT (out)

## TL084
designator U?
FET 15mV 3MHz 13V/us 2.8mA; Price: 0.35
footprint DIL14-300
simulation model TL082 (Model Description)
footprint SO14-150
pins on every part: 4 V+ (power) hidden to V+, 11 V- (power) hidden to V-
part A pins: 1 OUT (out), 2 IN- (in), 3 IN+ (in)
part B pins: 5 IN+ (in), 6 IN- (in), 7 OUT (out)
part C pins: 8 OUT (out), 9 IN- (in), 10 IN+ (in)
part D pins: 12 IN+ (in), 13 IN- (in), 14 OUT (out)

## TLE2074
designator U?
FET 5mV 9.4MHz 35V/us 6.3mA; Price: 15
footprint DIL14-300
simulation model TLE2074 (Model Description)
pins on every part: 4 V+ (power) hidden to V+, 11 V- (power) hidden to V-
part A pins: 1 OUT (out), 2 IN- (in), 3 IN+ (in)
part B pins: 5 IN+ (in), 6 IN- (in), 7 OUT (out)
part C pins: 8 OUT (out), 9 IN- (in), 10 IN+ (in)
part D pins: 12 IN+ (in), 13 IN- (in), 14 OUT (out)

## TLE2084C
designator U?
FET 7mV 9.4MHz 35V/us 6.3mA; Price: 15
footprint SO16-300
simulation model TLE2074 (Model Description)
pins on every part: 4 V+ (power) hidden to V+, 13 V- (power) hidden to V-
part A pins: 1 OUT (out), 2 IN- (in), 3 IN+ (in)
part B pins: 5 IN+ (in), 6 IN- (in), 7 OUT (out)
part C pins: 8 NC hidden, 9 NC hidden, 10 OUT (out), 11 IN- (in), 12 IN+ (in)
part D pins: 14 IN+ (in), 15 IN- (in), 16 OUT (out)

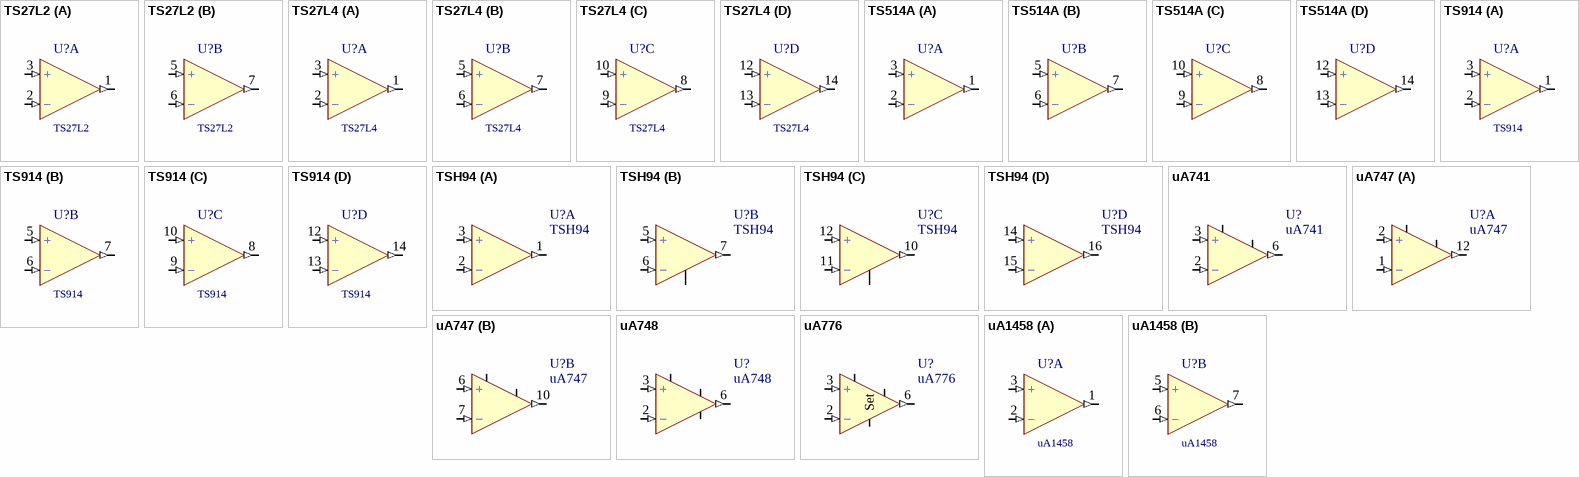
[diagram p5: symbols TS27L2 to uA1458]

## TS27L2
designator U?
CMOS 10mV 2uV/C 0.1MHz 0.04V/uS 3-16V 30uA; Price: 1.44
footprint DIL8-300a
footprint SO8-150
simulation model TS27x (Model Description)
pins on every part: 4 V- (power) hidden to V-, 8 V+ (power) hidden to V+
part A pins: 1 OUT (out), 2 -IN (in), 3 +IN (in)
part B pins: 5 +IN (in), 6 -IN (in), 7 OUT (out)

## TS27L4
designator U?
CMOS 10mV 2uV/C 0.1MHz 0.04V/uS 3-16V 60uA; Price: 1.8
footprint DIL14-300
footprint SO14-150
simulation model TS27x (Model Description)
pins on every part: 4 V+ (power) hidden to V+, 11 V- (power) hidden to V-
part A pins: 1 OUT (out), 2 IN- (in), 3 IN+ (in)
part B pins: 5 IN+ (in), 6 IN- (in), 7 OUT (out)
part C pins: 8 OUT (out), 9 IN- (in), 10 IN+ (in)
part D pins: 12 IN+ (in), 13 IN- (in), 14 OUT (out)

## TS514A
designator U?
0.5mV 3MHz 1.5V/us 0.5mA; Price: 2
footprint SO14-150
pins on every part: 4 V+ (power) hidden to V+, 11 V- (power) hidden to V-
part A pins: 1 OUT (out), 2 IN- (in), 3 IN+ (in)
part B pins: 5 IN+ (in), 6 IN- (in), 7 OUT (out)
part C pins: 8 OUT (out), 9 IN- (in), 10 IN+ (in)
part D pins: 12 IN+ (in), 13 IN- (in), 14 OUT (out)

## TS914
designator U?
CMOS 10mV 0.8MHz 0.5V/us 0.25mA R/R In/Out; Price: 0.454
footprint SO14-150
simulation model TS914 (Model Description)
pins on every part: 4 V+ (power) hidden to V+, 11 V- (power) hidden to V-
part A pins: 1 OUT (out), 2 IN- (in), 3 IN+ (in)
part B pins: 5 IN+ (in), 6 IN- (in), 7 OUT (out)
part C pins: 8 OUT (out), 9 IN- (in), 10 IN+ (in)
part D pins: 12 IN+ (in), 13 IN- (in), 14 OUT (out)

## TSH94
designator U?
3mV 150MHz 110V/uS  4.5mA 7-12V
footprint DIL16-300a
simulation model TSH94 (Model Description)
pins on every part: 4 V+ (power) hidden to V+, 13 V- (power) hidden to V-
part A pins: 1 OUT (out), 2 -IN (in), 3 +IN (in)
part B pins: 5 +IN (in), 6 -IN (in), 7 OUT (out), 8 St1
part C pins: 9 St2, 10 OUT (out), 11 -IN (in), 12 +IN (in)
part D pins: 14 +IN (in), 15 -IN (in), 16 OUT (out)

## uA741
designator U?
3mV  1MHz 0.7V/uS  1.7mA; Price: 0.24
footprint DIL8-300a
simulation model LM741/NS (SUBCKT)
pins: 1 N1/Comp, 2 -IN (in), 3 +IN (in), 4 V- (power) hidden to V-, 5 N2/Comp, 6 OUT (out), 7 V+ (power) hidden to V+
1 alternate drawing of the same symbol

## uA747
designator U?
3mV  1MHz 0.7V/uS  1.7mA
footprint DIL14-300
simulation model LM741/NS (Model Description)
pins on every part: 4 V- (power) hidden to V-
part A pins: 1 -IN (in), 2 +IN (in), 3 Offset2, 12 OUT (out), 13 V+ (power) hidden to V+, 14 Offset1
part B pins: 5 Offset1, 6 +IN (in), 7 -IN (in), 8 Offset2, 9 V+ hidden, 10 OUT (out), 11 hidden

## uA748
designator U?
3mV  1MHz 0.7V/uS  1.7mA
footprint DIL8-300a
pins: 1 N1/COMP, 2 -IN (in), 3 +IN (in), 4 V- (power) hidden to V-, 5 N2, 6 OUT (out), 7 V+ (power) hidden to V+, 8 COMP

## uA776
designator U?
5mV  3-18V Programable; Price: 0.8
footprint DIL8-300a
pins: 1 N1/Comp, 2 -IN (in), 3 +IN (in), 4 V- (power) hidden to V-, 5 N2/Comp, 6 OUT (out), 7 V+ (power) hidden to V+, 8 Set

## uA1458
designator U?
3mV  1MHz 0.7V/uS  1.7mA; Price: 0.28
footprint DIL8-300a
simulation model LM741/NS (Model Description)
pins on every part: 4 V- (power) hidden to V-, 8 V+ (power) hidden to V+
part A pins: 1 OUT (out), 2 -IN (in), 3 +IN (in)
part B pins: 5 +IN (in), 6 -IN (in), 7 OUT (out)